# Altium schematic symbol library Electronic Devices_LIB.SchLib: 703 symbols (part 5 of 8) (continued)
## IC_REG_LDO_1.1V_1A_TPS74611PQWDRVRQ1
designator U?, comment TPS74611PQWDRVRQ1
Voltage Regulator; linear, LDO; fixed; Vout: 1.1V; Vin: 1.5-6V; 1A; -40+125 deg.C; SMD; WSON6; Manufacturer: Texas Instruments; Supplier 1: Digikey; Manufacturer Part Number: TPS74611PQWDRVRQ1; RoHS: Yes; Category: Integrated Circuits (ICs); Stock 1: 29876; Pricing 1: 1=1.26, 10=0.915, 25=0.8288, 100=0.7334, 250=0.68796, 500=0.66054, 1000=0.63799, 3000=0.61013, 6000=0.59649, 9000=0.58967, 15000=0.5821 (USD); RoHS Compliant: Yes; Supplier Part Number 1: 296-TPS74611PQWDRVRQ1CT-ND
footprint IC_REG_LDO_1.1V_SON65P200X200X80-7N
pins: 1 OUT, 2 NC, 3 GND, 4 EN, 5 PG, 6 IN, 7 EP

## IC_REG_LDO_1.1V_LP5910-1.1YKAR
designator U?, comment LP5910-1.1YKAR
Low Dropout Regulator Low IQ Low Noise 300mA 1.1V 4-Pin DSBGA T/R; Manufacturer: Texas Instruments; Quiescent Current: 25uA; Dropout Voltage: 120mV; Output Type: Fixed; Output Configuration: Positive; Number of Regulators: 1; Max Input Voltage: 3.3V; Max Supply Current: 350uA; Power Supply Rejection Ratio (PSRR): 25dB; Supplier 1: Digikey; Manufacturer Part Number: LP5910-1.1YKAR; RoHS: Yes; Category: Voltage Regulators - Linear; Stock 1: 5290; Pricing 1: 1=0.76, 10=0.667, 25=0.6264, 100=0.5111, 250=0.47472, 500=0.404, 1000=0.3232 (USD); Mount: Surface Mount; Min Operating Temperature: -40°C; Max Operating Temperature: 125°C; Series: -; Packaging: Cut Tape; Min Output Voltage: 1.1V; Output Current: 300mA; Lead Free: Lead Free; RoHS Compliant: Yes; ComponentLink1URL: http://www.ti.com/lit/ds/symlink/lp5910.pdf?src-supplier=Digikey; ComponentLink1Description: http://www.ti.com/lit/ds/symlink/lp5910.pdf?src-supplier=Digikey; ComponentLink2URL: http://www.ti.com/general/docs/suppproductinfo.tsp?distId=10&amp;gotoUrl=http%3A%2F%2Fwww.ti.com%2Flit%2Fgpn%2Flp5910&src-supplier=Digikey; ComponentLink2Description: http://www.ti.com/general/docs/suppproductinfo.tsp?distId=10&amp;gotoUrl=http%3A%2F%2Fwww.ti.com%2Flit%2Fgpn%2Flp5910&src-supplier=Digikey; Supplier Part Number 1: 296-49822-1-ND
footprint IC_REG_LDO_BGA4C35P2X2_71X71X40 (4-DSBGA)
pins: A1 VIN, A2 VOUT, B1 EN, B2 GND

## IC_REG_LDO_1.5V_300mA_TLV70215PDBVR
designator U?, comment TLV70215PDBVR
LDO Regulator Positive 1.5V 0.3A 5-Pin SOT-23 T/R; Manufacturer: Texas Instruments; Number of Outputs: 1; Min Input Voltage: 2V; Max Input Voltage: 5.5V; Max Output Current: 300mA; Max Power Dissipation: 500mW; Min Current Limit: 320mA; Accuracy: 0.5%; Quiescent Current: 30uA; Dropout Voltage: 220mV; Output Type: Fixed; Supplier 1: Texas Instruments; Manufacturer Part Number: TLV70215PDBVR; RoHS: Yes; Category: Voltage Regulators - Linear; Stock 1: 196330; Pricing 1: 1=0.201, 100=0.13, 250=0.098, 1000=0.065 (USD); Mount: Surface Mount; Case/Package: SOT-23-5; Number of Pins: 5; Min Operating Temperature: -40°C; Max Operating Temperature: 125°C; Output Voltage: 1.5V; Package Quantity: 3000; Packaging: Cut Tape; Output Current: 300mA; Number of Regulators: 1; Polarity: Positive; Series: -; Lead Free: Lead Free; RoHS Compliant: Yes; ComponentLink1URL: https://datasheet.ciiva.com/29568/tlv70237-29568578.pdf?src-supplier=Digikey; ComponentLink1Description: https://datasheet.ciiva.com/29568/tlv70237-29568578.pdf?src-supplier=Digikey; Supplier Part Number 1: TLV70215PDBVR
footprint IC_REG_LDO_DBV5
pins: 1 IN, 2 GND (power), 3 EN, 4 NC, 5 OUT

## IC_REG_LDO_1.5V_LP590715QDQNRQ1
designator U?, comment LP590715QDQNRQ1
LDO Regulator 250mA 1.2V to 4.5V 4-Pin X2SON T/R Automotive; Manufacturer: Texas Instruments; Output Type: Fixed; Output Configuration: Positive; Max Input Voltage: 5.5V; Min Output Voltage: 1.5V; Power Supply Rejection Ratio (PSRR): 60dB; Number of Regulators: 1; Quiescent Current: 25uA; Max Supply Current: 425uA; Supplier 1: Digikey; Manufacturer Part Number: LP590715QDQNRQ1; RoHS: Yes; Category: Voltage Regulators - Linear; Stock 1: 56356; Pricing 1: 1=0.61, 10=0.533, 25=0.5008, 100=0.4088, 250=0.37976, 500=0.3232, 1000=0.25856 (USD); Mount: Surface Mount; Min Operating Temperature: -40°C; Max Operating Temperature: 125°C; Series: Automotive, AEC-Q100; Output Current: 250mA; Supplier Part Number 1: 296-LP590715QDQNRQ1CT-ND
footprint IC_REG_LDO_Texas_Instruments_DQN0004A_MFG (4-XDFN Exposed Pad)
pins: 1 OUT (power), 2 GND (power), 3 EN (in), 4 IN (power), 5 EP (power)

## IC_REG_LDO_1.8_1A_AZ1117CH-1.8TRG1
designator U?, comment AZ1117CH-1.8TRG1
AZ1117C Series 1.8 V 800 mA Fixed Surface Mount Voltage Regulator - SOT-223; Manufacturer: Diodes; Number of Outputs: 1; Max Input Voltage: 15V; Output Voltage: 1.8V; Dropout Voltage: 1.2V; Output Current: 800mA; Min Current Limit: 1A; Polarity: Positive; Quiescent Current: 6mA; Reference Voltage: 1.262V; Max Output Current: 1.35A; Accuracy: 1%; Supplier 1: Digikey; Manufacturer Part Number: AZ1117CH-1.8TRG1; RoHS: Yes; Category: Voltage Regulators - Linear; Stock 1: 40000; Pricing 1: 4000=0.06801, 8000=0.06219, 12000=0.05925, 20000=0.05597, 28000=0.05488 (USD); Mount: Surface Mount; Case/Package: SOT-223; Number of Pins: 3; Min Operating Temperature: -20°C; Max Operating Temperature: 125°C; Package Quantity: 4000; Packaging: Cut Tape; Number of Regulators: 1; Output Type: Fixed; Series: -; Number of Channels: 1; Length: 6.7mm; Width: 3.7mm; Height: 1.7mm; RoHS Compliant: Yes; ComponentLink1URL: https://datasheet.ciiva.com/29569/az1117c-29569909.pdf?src-supplier=Digikey; ComponentLink1Description: https://datasheet.ciiva.com/29569/az1117c-29569909.pdf?src-supplier=Digikey; Supplier Part Number 1: AZ1117CH-1.8TRG1DITR-ND
footprint SOT230P700X180-4N
pins: 1 ADJ/GND, 2 OUTPUT, 3 INPUT, 4 VOUT

## IC_REG_LDO_1.8V_250mA_LP5907UVX-1.8/NOPB
designator U?, comment LP5907UVX-1.8/NOPB
Low Dropout Regulators(LDO) Positive Fixed 200mV @ 250mA 5.5V 1.8V 250mA DSBGA-4 RoHS; Manufacturer: Texas Instruments; Number of Outputs: 1; Min Input Voltage: 2.2V; Quiescent Current: 25uA; Accuracy: 2%; Dropout Voltage: 50mV; Max Supply Current: 425uA; Power Supply Rejection Ratio (PSRR): 60dB; Supplier 1: Digikey; Manufacturer Part Number: LP5907UVX-1.8/NOPB; RoHS: Yes; Category: Voltage Regulators - Linear; Stock 1: 47909; Pricing 1: 1=0.66, 10=0.564, 25=0.5268, 100=0.4214, 250=0.39128, 500=0.33108, 1000=0.25583 (USD); Mount: Surface Mount; Case/Package: SMD/SMT; Min Operating Temperature: -40°C; Max Operating Temperature: 125°C; Package Quantity: 3000; Packaging: Tape and Reel; Max Input Voltage: 5.5V; Max Output Current: 250mA; Output Voltage: 1.8V; Polarity: Positive; Output Type: Fixed; Series: -; Output Configuration: Positive; Number of Regulators: 1; Min Output Voltage: 1.8V; Output Current: 250mA; Radiation Hardening: No; Lead Free: Lead Free; RoHS Compliant: Yes; ComponentLink1URL: https://datasheet.ciiva.com/6597/lp5907-6597398.pdf?src-supplier=Digikey; ComponentLink1Description: https://datasheet.ciiva.com/6597/lp5907-6597398.pdf?src-supplier=Digikey; ComponentLink2URL: https://datasheet.ciiva.com/14278/lp5907-14278557.pdf?src-supplier=Avnet; ComponentLink2Description: https://datasheet.ciiva.com/14278/lp5907-14278557.pdf?src-supplier=Avnet; Supplier Part Number 1: 296-35634-1-ND
footprint IC_REG_LDO_BGA4C35P2X2_71X71X40 (4-DSBGA)
pins: A1 VIN, A2 VOUT, B1 EN, B2 GND

## IC_REG_LDO_1.8V_300mA_TLV70218DBVR
designator U?, comment TLV70218DBVR
300-mA, high-PSRR, low-IQ, low-dropout voltage regulator with enable 5-SOT-23 -40 to 125; Manufacturer: Texas Instruments; Dropout Voltage: 260mV; Output Voltage: 1.8V; Output Current: 300mA; Number of Outputs: 1; Max Power Dissipation: 500mW; Max Input Voltage: 5.5V; Min Input Voltage: 2V; Min Current Limit: 320mA; Polarity: Positive; Accuracy: 2%; Quiescent Current: 30uA; Output Type: Fixed; Supplier 1: Texas Instruments; Manufacturer Part Number: TLV70218DBVR; RoHS: Yes; Category: Voltage Regulators - Linear; Stock 1: 61855; Pricing 1: 1=0.232, 100=0.15, 250=0.113, 1000=0.075 (USD); Case/Package: SOT-23-5; Number of Pins: 5; Min Operating Temperature: -40°C; Max Operating Temperature: 125°C; Package Quantity: 3000; Packaging: Tape and Reel; Max Output Current: 300mA; Number of Regulators: 1; Nominal Output Voltage: 1.8V; Max Output Voltage: 1.8V; Min Output Voltage: 1.8V; Series: -; Reach SVHC Compliant: No; Lead Free: Lead Free; RoHS Compliant: Yes; ComponentLink1URL: https://datasheet.ciiva.com/46629/tlv702-46629655.pdf?src-supplier=Digikey; ComponentLink1Description: https://datasheet.ciiva.com/46629/tlv702-46629655.pdf?src-supplier=Digikey; Supplier Part Number 1: TLV70218DBVR
footprint SOT23-5_SOT95P280X145-5N
pins: 1 IN, 2 GND, 3 EN, 4 NC, 5 OUT

## IC_REG_LDO_2.2V_250mA_LP5907UVX-2.2/NOPB
designator U?, comment LP5907UVX-2.2/NOPB
LDO Regulator Positive 2.2V 0.25A 4-Ball DSBGA T/R; Manufacturer: Texas Instruments; Supplier 1: Digikey; Manufacturer Part Number: LP5907UVX-2.2/NOPB; RoHS: Yes; Category: Integrated Circuits (ICs); Stock 1: 1759; Pricing 1: 1=0.66, 10=0.564, 25=0.5268, 100=0.4214, 250=0.39128, 500=0.33108, 1000=0.25583 (USD); Min Operating Temperature: -40°C; Max Operating Temperature: 125°C; RoHS Compliant: Yes; ComponentLink1URL: http://www.ti.com/general/docs/suppproductinfo.tsp?distId=10&amp;gotoUrl=http%3A%2F%2Fwww.ti.com%2Flit%2Fgpn%2Flp5907&src-supplier=Digikey; ComponentLink1Description: http://www.ti.com/general/docs/suppproductinfo.tsp?distId=10&amp;gotoUrl=http%3A%2F%2Fwww.ti.com%2Flit%2Fgpn%2Flp5907&src-supplier=Digikey; Supplier Part Number 1: 296-50216-1-ND
footprint IC_REG_LDO_BGA4C35P2X2_71X71X40 (4-DSBGA)
pins: A1 VIN, A2 VOUT, B1 EN, B2 GND

## IC_REG_LDO_2.8V_250mA_LP5907UVX-2.8/NOPB
designator U?, comment LP5907UVX-2.8/NOPB
LDO Regulator Pos 2.8V 0.25A 4-Pin DSBGA T/R; Manufacturer: Texas Instruments; Dropout Voltage: 120mV; Number of Outputs: 1; Min Input Voltage: 2.2V; Max Input Voltage: 5.5V; Max Output Current: 250mA; Polarity: Positive; Quiescent Current: 25uA; Accuracy: 2%; Output Type: Fixed; Max Supply Current: 425uA; Power Supply Rejection Ratio (PSRR): 60dB; Supplier 1: Digikey; Manufacturer Part Number: LP5907UVX-2.8/NOPB; RoHS: Yes; Category: Voltage Regulators - Linear; Stock 1: 56883; Pricing 1: 1=0.66, 10=0.564, 25=0.5268, 100=0.4214, 250=0.39128, 500=0.33108, 1000=0.25583 (USD); Mount: Surface Mount; Case/Package: SMD/SMT; Number of Pins: 4; Min Operating Temperature: -40°C; Max Operating Temperature: 125°C; Packaging: Tape and Reel; Output Voltage: 2.8V; Package Quantity: 3000; Output Current: 250mA; Number of Regulators: 1; Series: -; Output Configuration: Positive; Min Output Voltage: 2.8V; Radiation Hardening: No; Lead Free: Lead Free; RoHS Compliant: Yes; ComponentLink1URL: https://datasheet.ciiva.com/6583/lp5907-6583231.pdf?src-supplier=Digikey; ComponentLink1Description: https://datasheet.ciiva.com/6583/lp5907-6583231.pdf?src-supplier=Digikey; ComponentLink2URL: https://datasheet.ciiva.com/14278/lp5907-14278559.pdf?src-supplier=Avnet; ComponentLink2Description: https://datasheet.ciiva.com/14278/lp5907-14278559.pdf?src-supplier=Avnet; Supplier Part Number 1: 296-40378-1-ND
footprint IC_REG_LDO_BGA4C35P2X2_71X71X40 (4-DSBGA)
pins: A1 VIN, A2 VOUT, B1 EN, B2 GND

## IC_REG_LDO_2.8V_250mA_NCV8163ASN280T1G
designator U?, comment NCV8163ASN280T1G
LDO Regulator Pos 2.8V 0.25A Automotive 5-Pin TSOP T/R; Manufacturer: ON Semiconductor; Supplier 1: Digikey; Manufacturer Part Number: NCV8163ASN280T1G; RoHS: Yes; Category: Voltage Regulators - Linear; Stock 1: 5537; Pricing 1: 1=0.59, 10=0.521, 25=0.4896, 100=0.3712, 250=0.31592, 500=0.30014, 1000=0.22905 (USD); RoHS Compliant: Yes; ComponentLink1URL: http://www.onsemi.com/pub/Collateral/NCV8163-D.PDF?src-supplier=Digikey; ComponentLink1Description: http://www.onsemi.com/pub/Collateral/NCV8163-D.PDF?src-supplier=Digikey; ComponentLink2URL: https://datasheet.octopart.com/NCV8163ASN280T1G-ON-Semiconductor-datasheet-139012533.pdf?src-supplier=Future+Electronics; ComponentLink2Description: https://datasheet.octopart.com/NCV8163ASN280T1G-ON-Semiconductor-datasheet-139012533.pdf?src-supplier=Future+Electronics; Supplier Part Number 1: NCV8163ASN280T1GOSCT-ND

## IC_REG_LDO_3.3V_0.7A_XC6227C331PR-G
designator U?, comment XC6227C331PR-G
LDO Regulator Pos 3.3V 0.7A 5-Pin SOT-89 T/R; Manufacturer: Torex; Output Current: 700mA; Number of Regulators: 1; Output Type: Fixed; Output Configuration: Positive; Max Input Voltage: 6V; Quiescent Current: 220uA; Power Supply Rejection Ratio (PSRR): 65dB; Supplier 1: Digikey; Manufacturer Part Number: XC6227C331PR-G; RoHS: Yes; Category: Voltage Regulators - Linear; Stock 1: 42099; Pricing 1: 1=1.36, 10=0.857, 25=0.7232, 100=0.5713, 250=0.49708, 500=0.4516, 1000=0.41374, 2000=0.38224, 3000=0.36633, 5000=0.34859, 7000=0.33817, 10000=0.32809, 25000=0.30623 (USD); Mount: Surface Mount; Case/Package: SOT-89-5; Min Operating Temperature: -40°C; Max Operating Temperature: 85°C; Packaging: Cut Tape; Series: -; Min Output Voltage: 3.3V; RoHS Compliant: Yes; ComponentLink1URL: https://datasheet.ciiva.com/6586/xc6227-6586787.pdf?src-supplier=Digikey; ComponentLink1Description: https://datasheet.ciiva.com/6586/xc6227-6586787.pdf?src-supplier=Digikey; ComponentLink2URL: https://datasheet.ciiva.com/6586/xc6227-6586790.pdf?src-supplier=Digikey; ComponentLink2Description: https://datasheet.ciiva.com/6586/xc6227-6586790.pdf?src-supplier=Digikey; Supplier Part Number 1: 893-1175-1-ND
footprint IC_LDO_TOREX_XC6227C501PRG
pins: 1 CE, 2 VSS_1, 3 NC, 4 VIN, 5 VOUT, 6 VSS_2, 7 VSS_3

## IC_REG_LDO_3.3V_1A_AP2114H-3.3TRG1
designator U?, comment AP2114H-3.3TRG1
IC REG LDO 3.3V 1A SOT223; Manufacturer: Diodes; Supplier 1: Digikey; Manufacturer Part Number: AP2114H-3.3TRG1; RoHS: Yes; Category: Voltage Regulators - Linear; Stock 1: 34610; Pricing 1: 1=0.41, 10=0.332, 25=0.304, 100=0.2262, 250=0.20504, 500=0.16968, 1000=0.12726 (USD); ComponentLink1URL: https://datasheet.ciiva.com/29569/ap2114-29569881.pdf?src-supplier=Digikey; ComponentLink1Description: https://datasheet.ciiva.com/29569/ap2114-29569881.pdf?src-supplier=Digikey; ComponentLink2URL: https://datasheet.ciiva.com/29569/ap2114-29569882.pdf?src-supplier=Digikey; ComponentLink2Description: https://datasheet.ciiva.com/29569/ap2114-29569882.pdf?src-supplier=Digikey; ComponentLink3URL: https://datasheet.ciiva.com/29569/ap2114-29569883.pdf?src-supplier=Digikey; ComponentLink3Description: https://datasheet.ciiva.com/29569/ap2114-29569883.pdf?src-supplier=Digikey; Supplier Part Number 1: AP2114H-3.3TRG1DICT-ND
footprint IC_REG_SOT230P700X180-4N (SOT223, 4-Leads, Body 6.50x7.00mm (avg), Pitch 2.30mm, IPC Medium Density)
pins: 1 GND, 2 VOUT, 3 VIN, 4 VOUT

## IC_REG_LDO_3.3V_1A_AZ1117IH-3.3TRG1
designator U?, comment AZ1117IH-3.3TRG1
Linear Voltage Regulator IC Positive Fixed 1 Output 3.3V 800mA SOT-223; Manufacturer: Diodes; Dropout Voltage: 1.2V; Number of Regulators: 1; Min Current Limit: 1A; Supplier 1: Digi-Key; Manufacturer Part Number: AZ1117IH-3.3TRG1; RoHS: Yes; Category: Voltage Regulators - Linear; Stock 1: 194076; Pricing 1: 1=0.37, 10=0.303, 25=0.2768, 100=0.2061, 250=0.18676, 500=0.15456, 1000=0.11592 (USD); Mount: Surface Mount; Case/Package: TO-261-4; Number of Pins: 3; Min Operating Temperature: -40°C; Max Operating Temperature: 125°C; Packaging: Cut Tape; Output Voltage: 3.3V; Output Current: 800mA; Series: -; RoHS Compliant: Yes; ComponentLink1URL: https://www.diodes.com/assets/Datasheets/AZ1117I.pdf?src-supplier=Digi-Key; ComponentLink1Description: https://www.diodes.com/assets/Datasheets/AZ1117I.pdf?src-supplier=Digi-Key; ComponentLink2URL: https://datasheet.octopart.com/AZ1117IH-3.3TRG1-Diodes-Inc.-datasheet-141402639.pdf?src-supplier=SHENGYU+ELECTRONICS; ComponentLink2Description: https://datasheet.octopart.com/AZ1117IH-3.3TRG1-Diodes-Inc.-datasheet-141402639.pdf?src-supplier=SHENGYU+ELECTRONICS; Supplier Part Number 1: AZ1117IH-3.3TRG1DICT-ND
footprint IC_REG_SOT230P700X180-4N (SOT223, 4-Leads, Body 6.50x7.00mm (avg), Pitch 2.30mm, IPC Medium Density)
pins: 1 GND, 2 OUT, 3 IN, 4 VOUT

## IC_REG_LDO_3.3V_150MA_TPS70933DBVR
designator U?, comment TPS70933DBVR
LDO Regulator Pos 3.3V 0.15A 5-Pin SOT-23 T/R; Manufacturer: Texas Instruments; Dropout Voltage: 960mV; Number of Outputs: 1; Min Input Voltage: 2.7V; Output Current: 150mA; Max Input Voltage: 30V; Min Current Limit: 200mA; Polarity: Positive; Accuracy: 2%; Power Supply Rejection Ratio (PSRR): 80dB; Quiescent Current: 1uA; Output Type: Fixed; Supplier 1: Mouser; Manufacturer Part Number: TPS70933DBVR; RoHS: Yes; Category: Voltage Regulators - Linear; Stock 1: 141237; Pricing 1: 1=1.3, 10=1.11, 50=1.11, 100=0.849, 500=0.751, 1000=0.593, 3000=0.471, 10000=0.471 (USD); Mount: Surface Mount; Case/Package: SOT-23-5; Number of Pins: 5; Min Operating Temperature: -40°C; Max Operating Temperature: 125°C; Packaging: Tape and Reel; Output Voltage: 3.3V; Package Quantity: 1; Max Output Current: 150mA; Number of Regulators: 1; Nominal Output Voltage: 3.3V; Series: -; Radiation Hardening: No; Reach SVHC Compliant: No; Lead Free: Lead Free; RoHS Compliant: Yes; ComponentLink1URL: https://datasheet.ciiva.com/6580/tps70933-6580912.pdf?src-supplier=Digikey; ComponentLink1Description: https://datasheet.ciiva.com/6580/tps70933-6580912.pdf?src-supplier=Digikey; ComponentLink2URL: https://datasheet.ciiva.com/6580/tps709-6580908.pdf?src-supplier=Digikey; ComponentLink2Description: https://datasheet.ciiva.com/6580/tps709-6580908.pdf?src-supplier=Digikey; ComponentLink3URL: https://datasheet.ciiva.com/6580/tps709-6580911.pdf?src-supplier=Digikey; ComponentLink3Description: https://datasheet.ciiva.com/6580/tps709-6580911.pdf?src-supplier=Digikey; Supplier Part Number 1: 595-TPS70933DBVR
footprint IC_REG_LDO_3.3V_SOT95P280X145-5N
pins: 1 IN (in), 2 GND (power), 3 EN (in), 4 NC, 5 OUT (power)

## IC_REG_LDO_5.5V_0.15A_LDCL015MR
designator U?, comment LDCL015MR
LDO Regulator Pos 0.8V to 5.5V 0.15A 5-Pin SOT-23 T/R; Manufacturer: STMicroelectronics; Output Voltage: 800mV; Min Input Voltage: 1.8V; Max Output Current: 150mA; Number of Outputs: 1; Polarity: Positive; Quiescent Current: 160uA; Accuracy: 2%; Output Type: Adjustable; Dropout Voltage: 50mV; Max Output Voltage: 5.4V; Power Supply Rejection Ratio (PSRR): 51dB; Supplier 1: Digi-Key; Manufacturer Part Number: LDCL015MR; RoHS: Yes; Category: Voltage Regulators - Linear; Stock 1: 49636; Pricing 1: 1=1.51, 10=1.351, 25=1.282, 100=1.0532, 250=0.98452, 500=0.87004, 1000=0.68688 (USD); Mount: Surface Mount; Case/Package: SOT-23; Number of Pins: 5; Min Operating Temperature: -40°C; Max Operating Temperature: 125°C; Max Input Voltage: 5.5V; Output Current: 150mA; Packaging: Tape and Reel; Number of Regulators: 1; Min Output Voltage: 800mV; Reference Voltage: 800mV; Series: -; Output Configuration: Positive; Length: 2.95mm; Width: 1.6mm; Height: 1.3mm; Reach SVHC Compliant: No; Lead Free: Lead Free; RoHS Compliant: Yes; ComponentLink1URL: https://datasheet.ciiva.com/22651/1827871-22651045.pdf?src-supplier=Element14; ComponentLink1Description: https://datasheet.ciiva.com/22651/1827871-22651045.pdf?src-supplier=Element14; ComponentLink2URL: https://datasheet.ciiva.com/4885/dm00037343-99499-4885392.pdf?src-supplier=Mouser; ComponentLink2Description: https://datasheet.ciiva.com/4885/dm00037343-99499-4885392.pdf?src-supplier=Mouser; ComponentLink3URL: https://datasheet.ciiva.com/41439/001184664-da-01-en-ic-reg-ldo-adj-0-ldcl015mr-sot-23-5-stm-41439787.pdf?src-supplier=Conrad; ComponentLink3Description: https://datasheet.ciiva.com/41439/001184664-da-01-en-ic-reg-ldo-adj-0-ldcl015mr-sot-23-5-stm-41439787.pdf?src-supplier=Conrad; ComponentLink4URL: https://datasheet.ciiva.com/2045/dm00037343-2045558.pdf?src-supplier=Digi-Key; ComponentLink4Description: https://datasheet.ciiva.com/2045/dm00037343-2045558.pdf?src-supplier=Digi-Key; ComponentLink5URL: https://datasheet.ciiva.com/2045/dm00037343-2045559.pdf?src-supplier=Digi-Key; ComponentLink5Description: https://datasheet.ciiva.com/2045/dm00037343-2045559.pdf?src-supplier=Digi-Key; ComponentLink6URL: https://datasheet.ciiva.com/2045/dm00037343-2045560.pdf?src-supplier=Digi-Key; ComponentLink6Description: https://datasheet.ciiva.com/2045/dm00037343-2045560.pdf?src-supplier=Digi-Key; Supplier Part Number 1: 497-12085-1-ND
footprint IC_REG_SOT95P280X145-5N (SOT-23-5)
pins: 1 VIN, 2 GND, 3 EN, 4 ADJ, 5 VOUT

## IC_REG_LDO_5V_1A_AZ1117IH-5.0TRG1
designator U?, comment AZ1117IH-5.0TRG1
LDO Regulator Pos 5V 1A 3-Pin SOT-223 T/R; Manufacturer: Diodes; Output Current: 800mA; Dropout Voltage: 1.2V; Number of Regulators: 1; Supplier 1: Digi-Key; Manufacturer Part Number: AZ1117IH-5.0TRG1; RoHS: Yes; Category: Voltage Regulators - Linear; Stock 1: 138078; Pricing 1: 1=0.40000, 10=0.32100, 25=0.29360, 100=0.21840, 250=0.19796, 500=0.16384, 1000=0.12288 (USD); Mount: Surface Mount; Case/Package: TO-261-4; Min Operating Temperature: -40°C; Max Operating Temperature: 125°C; Packaging: Tape and Reel; Output Voltage: 5V; Min Current Limit: 1A; RoHS Compliant: Yes; ComponentLink1URL: https://www.diodes.com/assets/Datasheets/AZ1117I.pdf?src-supplier=Digi-Key; ComponentLink1Description: https://www.diodes.com/assets/Datasheets/AZ1117I.pdf?src-supplier=Digi-Key; Supplier Part Number 1: AZ1117IH-5.0TRG1DIDKR-ND
footprint IC_REG_SOT230P700X180-4N (SOT223, 4-Leads, Body 6.50x7.00mm (avg), Pitch 2.30mm, IPC Medium Density)
pins: 1 GND, 2 OUT, 3 IN, 4 VOUT

## IC_REG_LDO_ADJ_5A_AZ1084CD-ADJTRG1
designator U?, comment AZ1084CD-ADJTRG1
IC REG LDO ADJ 5A TO252-2; Manufacturer: Diodes; Number of Outputs: 1; Max Input Voltage: 12V; Dropout Voltage: 1.35V; Output Voltage: 1.25V; Min Current Limit: 5.5A; Polarity: Positive; Quiescent Current: 10mA; Reference Voltage: 1.262V; Output Type: Adjustable; Supplier 1: Digikey; Manufacturer Part Number: AZ1084CD-ADJTRG1; RoHS: Yes; Category: Voltage Regulators - Linear; Stock 1: 7271; Pricing 1: 1=0.54, 10=0.458, 25=0.4276, 100=0.3422, 250=0.31776, 500=0.26886, 1000=0.20776 (USD); Mount: Surface Mount; Case/Package: TO-252-3; Number of Pins: 3; Min Operating Temperature: 0°C; Max Operating Temperature: 125°C; Max Output Current: 5A; Package Quantity: 1; Packaging: Cut Tape; Output Current: 5A; Number of Regulators: 1; Series: -; Length: 6.73mm; Width: 6.22mm; Height: 2.38mm; RoHS Compliant: Yes; ComponentLink1URL: https://datasheet.ciiva.com/29568/az1084c-29568984.pdf?src-supplier=Digikey; ComponentLink1Description: https://datasheet.ciiva.com/29568/az1084c-29568984.pdf?src-supplier=Digikey; ComponentLink2URL: https://datasheet.ciiva.com/29568/az1084c-29568985.pdf?src-supplier=Digikey; ComponentLink2Description: https://datasheet.ciiva.com/29568/az1084c-29568985.pdf?src-supplier=Digikey; ComponentLink3URL: https://datasheet.ciiva.com/29568/az1084c-29568991.pdf?src-supplier=Digikey; ComponentLink3Description: https://datasheet.ciiva.com/29568/az1084c-29568991.pdf?src-supplier=Digikey; Supplier Part Number 1: AZ1084CD-ADJTRG1DICT-ND
footprint IC_REG_LDO_ADJ_DPAK457P1010X238-3N (TO-252-3, DPAK (2 Leads + Tab), SC-63)
pins: 1 ADJ/GND, 2 OUT, 3 IN

## IC_REG_LDO_ADJ_5A_MIC69502WR-TR
designator U?, comment MIC69502WR-TR
MIC69502 Series ADJ 0.5 to 5.5 V Output 5 A SMT LDO Regulator - SPAK-7 T/R; Manufacturer: Microchip; Dropout Voltage: 250mV; Max Input Voltage: 5.5V; Min Input Voltage: 1.65V; Max Output Current: 5A; Number of Regulators: 1; Min Current Limit: 5.5A; Min Output Voltage: 500mV; Supplier 1: Digikey; Manufacturer Part Number: MIC69502WR-TR; RoHS: No; Category: Voltage Regulators - Linear; Stock 1: 9193; Pricing 1: 1=3.82, 25=3.19, 100=2.9 (USD); Mount: Surface Mount; Number of Pins: 7; Min Operating Temperature: -40°C; Max Operating Temperature: 125°C; Package Quantity: 750; Packaging: Tape and Reel; Output Voltage: 5.5V; Output Current: 5A; Series: -; Lead Free: Lead Free; ComponentLink1URL: https://datasheet.ciiva.com/2065/mic69502-2065328.pdf?src-supplier=Digikey; ComponentLink1Description: https://datasheet.ciiva.com/2065/mic69502-2065328.pdf?src-supplier=Digikey; Supplier Part Number 1: MIC69502WR-CT-ND
footprint IC_LDO_Microchip_Technology_SPAK-7LD-PL-1_MFG
pins: 1 EN (in), 2 VIN (power), 3 VIN (power), 4 GND (power), 5 VOUT (power), 6 VOUT (power), 7 ADJ, 8 TAB

## IC_REG_LDO_ADJ_5V_400mA_RT9043GB
designator U?, comment RT9043GB
Linear Voltage Regulator IC Positive Adjustable 1 Output 1.2 V ~ 3.3 V 400mA SOT-23-5; Manufacturer: Richtek; Dropout Voltage: 230mV; Max Input Voltage: 5.5V; Min Input Voltage: 2.2V; Output Voltage: 3.3V; Number of Regulators: 1; Power Rating: 400mW; Quiescent Current: 50uA; Supplier 1: Digikey; Manufacturer Part Number: RT9043GB; RoHS: Yes; Category: Voltage Regulators - Linear; Stock 1: 42392; Pricing 1: 1=0.51, 10=0.413, 25=0.378, 100=0.2812, 250=0.25484, 500=0.21088, 1000=0.15817, 3000=0.14499, 6000=0.1362, 15000=0.12741, 30000=0.11687, 75000=0.11247 (USD); Mount: Surface Mount; Case/Package: SOT-23-5; Number of Pins: 5; Min Operating Temperature: -40°C; Max Operating Temperature: 85°C; Packaging: Cut Tape; Max Output Current: 400mA; Output Current: 400mA; Min Current Limit: 400mA; Number of Outputs: 1; Series: -; Reach SVHC Compliant: No; Lead Free: Lead Free; RoHS Compliant: Yes; ComponentLink1URL: https://datasheet.ciiva.com/2046/3d3futf-83fb3frfm5mdqzltaylnbkzg3d3d3f3d-2046897.pdf?src-supplier=Digikey; ComponentLink1Description: https://datasheet.ciiva.com/2046/3d3futf-83fb3frfm5mdqzltaylnbkzg3d3d3f3d-2046897.pdf?src-supplier=Digikey; ComponentLink2URL: https://datasheet.ciiva.com/24154/rt9043gb-24154485.pdf?src-supplier=Future+Electronics; ComponentLink2Description: https://datasheet.ciiva.com/24154/rt9043gb-24154485.pdf?src-supplier=Future+Electronics; ComponentLink3URL: https://datasheet.ciiva.com/22712/1720541-22712648.pdf?src-supplier=Element14; ComponentLink3Description: https://datasheet.ciiva.com/22712/1720541-22712648.pdf?src-supplier=Element14; Supplier Part Number 1: 1028-1012-1-ND
footprint IC_REG_LDO_SOT94P279X130-5N
pins: 1 VIN, 2 GND, 3 EN, 4 FB, 5 VOUT

## IC_REG_LDO_ADJ_300mA_ADP123AUJZ-R7
designator U?, comment ADP123AUJZ-R7
IC REG LDO ADJ 0.3A TSOT23-5; Manufacturer: Analog Devices; Output Current: 300mA; Output Voltage: 5V; Max Input Voltage: 5.5V; Min Input Voltage: 2.3V; Min Output Voltage: 800mV; Nominal Supply Current: 45uA; Power Supply Rejection Ratio (PSRR): 60dB; Max Supply Current: 170uA; Dropout Voltage: 85mV; Number of Outputs: 1; Min Current Limit: 350mA; Polarity: Positive; Reference Voltage: 500mV; Accuracy: 1%; Output Type: Adjustable; Supplier 1: Digikey; Manufacturer Part Number: ADP123AUJZ-R7; RoHS: Yes; Category: Voltage Regulators - Linear; Stock 1: 53225; Pricing 1: 1=2.26, 10=1.447, 25=1.234, 100=0.994, 250=0.87696, 500=0.80542, 1000=0.74592, 3000=0.6715, 6000=0.63465, 9000=0.61607, 15000=0.59536 (USD); Case/Package: TSOT; Number of Pins: 5; Contact Plating: Tin,Matte; Min Operating Temperature: -40°C; Max Operating Temperature: 125°C; Max Output Current: 300mA; Packaging: Tape and Reel; Max Output Voltage: 5V; Operating Supply Current: 45uA; Series: -; Number of Regulators: 1; Quiescent Current: 45uA; Output Voltage Accuracy: 1%; Length: 2.9mm; Width: 1.6mm; Height: 0.9mm; Reach SVHC Compliant: No; Lead Free: Contains Lead; RoHS Compliant: Yes; ComponentLink1URL: https://datasheet.ciiva.com/2040/adp122-123-2040697.pdf?src-supplier=Digikey; ComponentLink1Description: https://datasheet.ciiva.com/2040/adp122-123-2040697.pdf?src-supplier=Digikey; ComponentLink2URL: https://datasheet.ciiva.com/2040/adp122-123-2040698.pdf?src-supplier=Digikey; ComponentLink2Description: https://datasheet.ciiva.com/2040/adp122-123-2040698.pdf?src-supplier=Digikey; ComponentLink3URL: https://datasheet.ciiva.com/2040/adp122-123-2040699.pdf?src-supplier=Digikey; ComponentLink3Description: https://datasheet.ciiva.com/2040/adp122-123-2040699.pdf?src-supplier=Digikey; Supplier Part Number 1: 505-ADP123AUJZ-R7CT-ND
footprint SOT23-5_SOT95P280X100-5N
pins: 1 VIN, 2 GND, 3 EN, 4 ADJ, 5 VOUT

## IC_REG_LINEAR_5.5V_1A_OPTPS7A9401DSCR
designator U?, comment TPS7A9401DSCR
Adjustable Positive LDO Regulator, 0V Min, 5.5V Max, 0.24V Dropout, PDSO10; Manufacturer: Texas Instruments; Accuracy: 1%; Dropout Voltage: 165mV; Max Supply Voltage: 5.7V; Min Supply Voltage: 1.7V; Number of Outputs: 1NUMBER; Output Current: 1A; Supplier 1: Digi-Key; Manufacturer Part Number: TPS7A9401DSCR; RoHS: No; Category: Voltage Regulators - Linear; Stock 1: 1712; Pricing 1: 1=6.97, 10=6.297, 25=6.0044, 100=5.2136, 250=4.97928, 500=4.53996, 1000=3.95415 (USD); Number of Pins: 10NUMBER; Min Operating Temperature: -40°C; Max Operating Temperature: 125°C; Length: 3mm; Width: 3mm; Height: 800um; Thickness: 750um; Supplier Part Number 1: 296-TPS7A9401DSCRCT-ND
footprint IC_REG_SON50P300X300X80-11N-D (10-WFDFN Exposed Pad)
pins: 1 IN_1, 2 IN_2, 3 EN_UV, 4 PG, 5 FB_PG, 6 GND, 7 NR/SS, 8 SNS, 9 OUT_1, 10 OUT_2, 11 EP

## IC_REG_LINEAR_06V_1A_MCT7806
designator U?, comment MCT7806
Positive Regulator linear  6V-1A; Manufacturer: Chinese standard; Output Voltage: 6V; Output Current: 1A; Manufacturer Part number: MCT7806; ComponentLink1Description: file:///C:/Users/Elio%20Fagundez/Documents/Upwork%202023/Project%20%2316%20(%20ADN00200%20-%20HUMBERTO%20MATIAS)/Documentation/MCT-7800_REGULATOR.pdf; ComponentLink1URL: file:///C:/Users/Elio%20Fagundez/Documents/Upwork%202023/Project%20%2316%20(%20ADN00200%20-%20HUMBERTO%20MATIAS)/Documentation/MCT-7800_REGULATOR.pdf
footprint IC_REG_DPAK254P1420X457-3N (D2-PAK, 3-Pads, Body 7.77x8.48mm (max), IPC Medium Density)
pins: 1 VIN, 2 GND, 3 VOUT

## IC_RF_DIPLEXER_DPX105850DT-6018A1
designator U?, comment DPX105850DT-6018A1
RF Diplexer Single 2400MHz to 2500MHz/5150MHz to 5850MHz 4-Pin Case 0402(1006Metric) T/R; Manufacturer: TDK; Supplier 1: Mouser; Manufacturer Part Number: DPX105850DT-6018A1; RoHS: Yes; Stock 1: 12187; Pricing 1: 1=0.26, 10=0.242, 25=0.219, 50=0.212, 100=0.192, 250=0.169, 500=0.142, 1000=0.121, 2500=0.114, 10000=0.114 (USD); Mount: Surface Mount; Case Code (Imperial): 0402; Case Code (Metric): 1005; Series: DPX; Packaging: Cut Tape; RoHS Compliant: Yes; Supplier Part Number 1: 810-DPX10585DT6018A1
footprint IC_RF_DIPLEXER_DPX105850DT6018A1 (0402 (1005 Metric), 4 PC Pad)
pins: 1 COMMON, 2 GND, 3 HIGH-BAND, 4 LOW-BAND

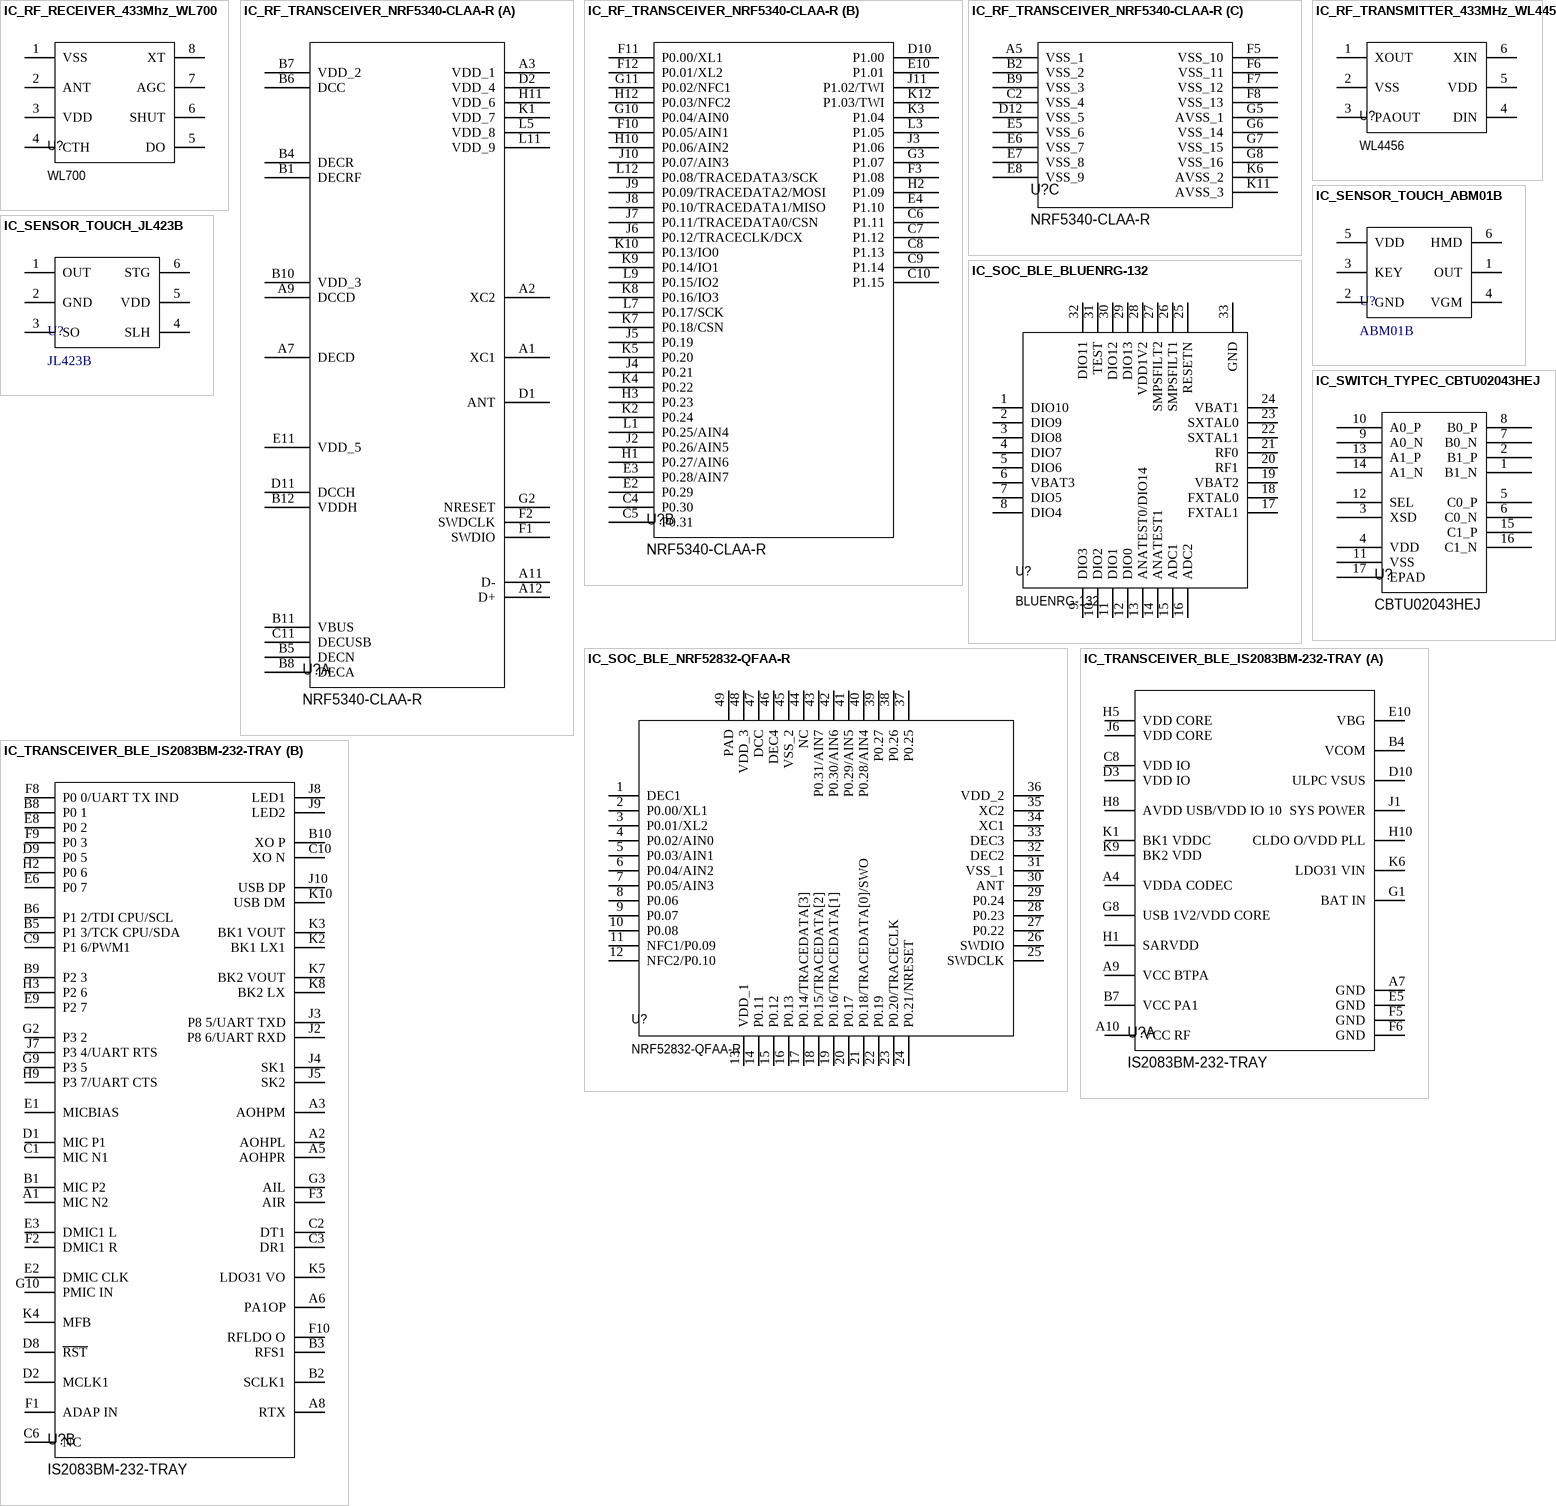
[diagram p27: symbols IC_RF_RECEIVER_433Mhz_WL700 to IC_TRANSCEIVER_BLE_IS2083BM-232-TRAY]

## IC_RF_RECEIVER_433Mhz_WL700
designator U?, comment WL700
10Kbps 300MHz~440MHz SOP-8 RF Transceiver ICs ROHS; Manufacturer: WL; Receive Current: 3.5mA; Manufacturer part number: WL700; Frequency Range: 300MHz~440MHz; ComponentLink1Description: Supplier; ComponentLink1URL: https://www.lcsc.com/product-detail/span-style-background-color-ff0-RF-span-Transceiver-ICs_WL-WL700_C708723.html; ComponentLink2Description: Datasheet; ComponentLink2URL: https://datasheet.lcsc.com/lcsc/2008071536_WL-WL700_C708723.pdf; Supplier: LCSC
footprint IC_RF_SOP127P580X175-8N (SOP, 8-Leads, Body 5.10x3.70mm, Pitch 1.27mm, IPC Medium Density)
pins: 1 VSS, 2 ANT, 3 VDD, 4 CTH, 5 DO, 6 SHUT, 7 AGC, 8 XT

## IC_RF_TRANSCEIVER_NRF5340-CLAA-R
designator U?, comment NRF5340-CLAA-R
Rf Transceiver, 2.4Ghz, -40 To 105Deg C Rohs Compliant: Yes |Nordic Semiconductor NRF5340-CLAA-R; Supplier 1: Digikey; Manufacturer: Nordic Semiconductor; Manufacturer Part Number: NRF5340-CLAA-R; RoHS: No; Category: RF Receivers, Transceivers; Stock 1: 17516; Pricing 1: 1=7.28, 100=6.2, 500=5.39004, 1000=4.93002 (USD); Supplier Part Number 1: 4823-NRF5340-CLAA-RCT-ND
footprint RF_TRANSCEIVER_BGA95C35P12X11_439X399X45 (95-WLCSP (4.39x3.85))
part A pins: A1 XC1, A2 XC2, A3 VDD_1, A7 DECD, A9 DCCD, A11 D-, A12 D+, B1 DECRF, B4 DECR, B5 DECN, B6 DCC, B7 VDD_2, B8 DECA, B10 VDD_3, B11 VBUS, B12 VDDH, C11 DECUSB, D1 ANT, D2 VDD_4, D11 DCCH, E11 VDD_5, F1 SWDIO, F2 SWDCLK, G2 NRESET, H11 VDD_6, K1 VDD_7, L5 VDD_8, L11 VDD_9
part B pins: C4 P0.30, C5 P0.31, C6 P1.11, C7 P1.12, C8 P1.13, C9 P1.14, C10 P1.15, D10 P1.00, E2 P0.29, E3 P0.28/AIN7, E4 P1.10, E10 P1.01, F3 P1.08, F10 P0.05/AIN1, F11 P0.00/XL1, F12 P0.01/XL2, G3 P1.07, G10 P0.04/AIN0, G11 P0.02/NFC1, H1 P0.27/AIN6, H2 P1.09, H3 P0.23, H10 P0.06/AIN2, H12 P0.03/NFC2, J2 P0.26/AIN5, J3 P1.06, J4 P0.21, J5 P0.19, J6 P0.12/TRACECLK/DCX, J7 P0.11/TRACEDATA0/CSN, J8 P0.10/TRACEDATA1/MISO, J9 P0.09/TRACEDATA2/MOSI, J10 P0.07/AIN3, J11 P1.02/TWI, K2 P0.24, K3 P1.04, K4 P0.22, K5 P0.20, K7 P0.18/CSN, K8 P0.16/IO3, K9 P0.14/IO1, K10 P0.13/IO0, K12 P1.03/TWI, L1 P0.25/AIN4, L3 P1.05, L7 P0.17/SCK, L9 P0.15/IO2, L12 P0.08/TRACEDATA3/SCK
part C pins: A5 VSS_1, B2 VSS_2, B9 VSS_3, C2 VSS_4, D12 VSS_5, E5 VSS_6, E6 VSS_7, E7 VSS_8, E8 VSS_9, F5 VSS_10, F6 VSS_11, F7 VSS_12, F8 VSS_13, G5 AVSS_1, G6 VSS_14, G7 VSS_15, G8 VSS_16, K6 AVSS_2, K11 AVSS_3
